# Altium footprint library conn_buttons.PcbLib: 5 footprints
Each footprint in its own frame and in the unit in brackets; x right, y up, seen from the top. Pads: shape width x height; smd on the part's side, far side on the other; paste and mask are expansions set on the pad; w line width, h text height; cw(c..) or ccw(c..) is an arc to the next point about the centre after c.
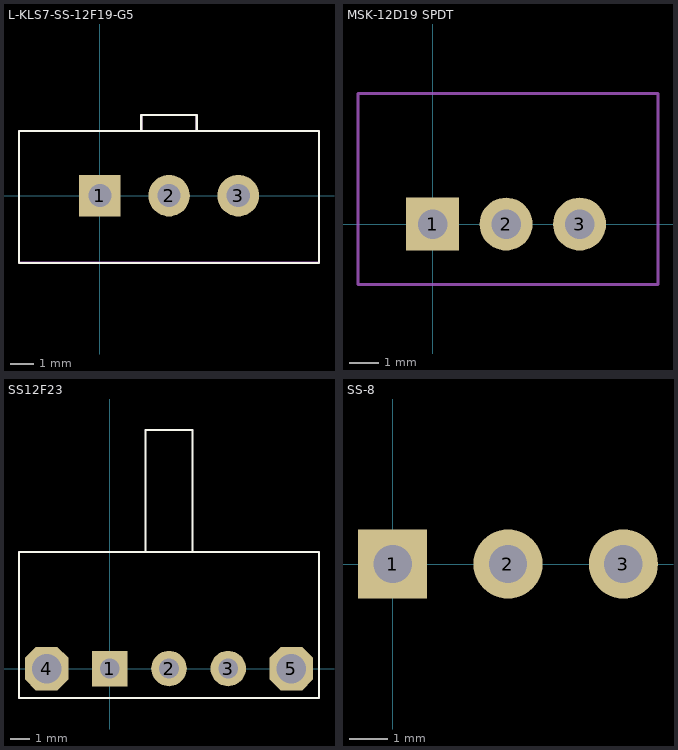
[diagram p0: the footprints below, top view; thin cyan lines are the x and y axes]

## L-KLS7-SS-12F19-G5 [mm]
pads (3):
  rect 1.8x1.8 hole 1: 1(0,0)
  round 1.8 hole 1: 2(3,0) 3(6,0)
Top Overlay:
  lines w0.1: 1.8,2.8 1.8,3.5 4.2,3.5 4.2,2.8 ; -3.503,-2.921 9.497,-2.921 9.499,2.8 -3.501,2.8 -3.503,-2.921
Mechanical 29:
  lines w0.1: 1.8,2.8 1.8,3.5 4.2,3.5 4.2,2.8 ; -3.5,-2.9 9.499,-2.9 9.499,2.8 -3.5,2.8 -3.5,-2.9
  text ".Designator" at 0.5,2 h1
3D body "SK-12F14_G7.STEP": height 6.05, standoff -2.55, extent -3.503,-2.921 9.497,9.279

## MSK-12D19 SPDT [mm]
pads (3):
  rect 1.8x1.8 hole 1: 1(0,0)
  round 1.8 hole 1: 2(2.5,0) 3(5,0)
Mechanical 29:
  lines w0.1: -2.535,-2.057 7.665,-2.057 7.665,4.444 -2.535,4.444 -2.535,-2.057
  text ".Designator" at 0.5,2 h1
3D body "slide switch spd 3 pin.stp": height 5.15, standoff -2.9, extent -2.535,-2.057 7.665,4.444

## PCBComponent_1 [mm]

## SS12F23 [mm]
pads (5):
  rect 1.8x1.8 hole 1: 1(0,0)
  round 1.8 hole 1: 2(3,0) 3(6,0)
  oct 2.2x2.2 hole 1.5: 4(-3.2,0) 5(9.2,0)
Top Overlay:
  lines w0.1: 1.8,5.9 1.8,12.1 4.2,12.1 4.2,5.9 ; -4.601,-1.5 -4.599,5.9 10.601,5.9 10.599,-1.5 -4.601,-1.5
Mechanical 29:
  lines w0.1: 1.8,12.1 4.2,12.1 ; -4.6,-1.5 -4.6,5.9 10.6,5.9 10.6,-1.5 -4.6,-1.5
  text ".Designator" at 0.5,2 h1
3D body "SS12F23.STEP": height 6.25, standoff -2.85, extent -3.5,-0.8 9.5,12.1

## SS-8 [mm]
pads (3):
  rect 1.8x1.8 hole 1: 1(0,0)
  round 1.8 hole 1: 2(3,0) 3(6,0)
3D body "SS-8.step": height 5, standoff -2.49, extent -2.305,-6.372 6.305,2